# Altium footprint library LukaLIBRARY.PcbLib: 784 footprints (part 21 of 49)
Each footprint in its own frame and in the unit in brackets; x right, y up, seen from the top. Pads: shape width x height; smd on the part's side, far side on the other; paste and mask are expansions set on the pad; w line width, h text height; cw(c..) or ccw(c..) is an arc to the next point about the centre after c.
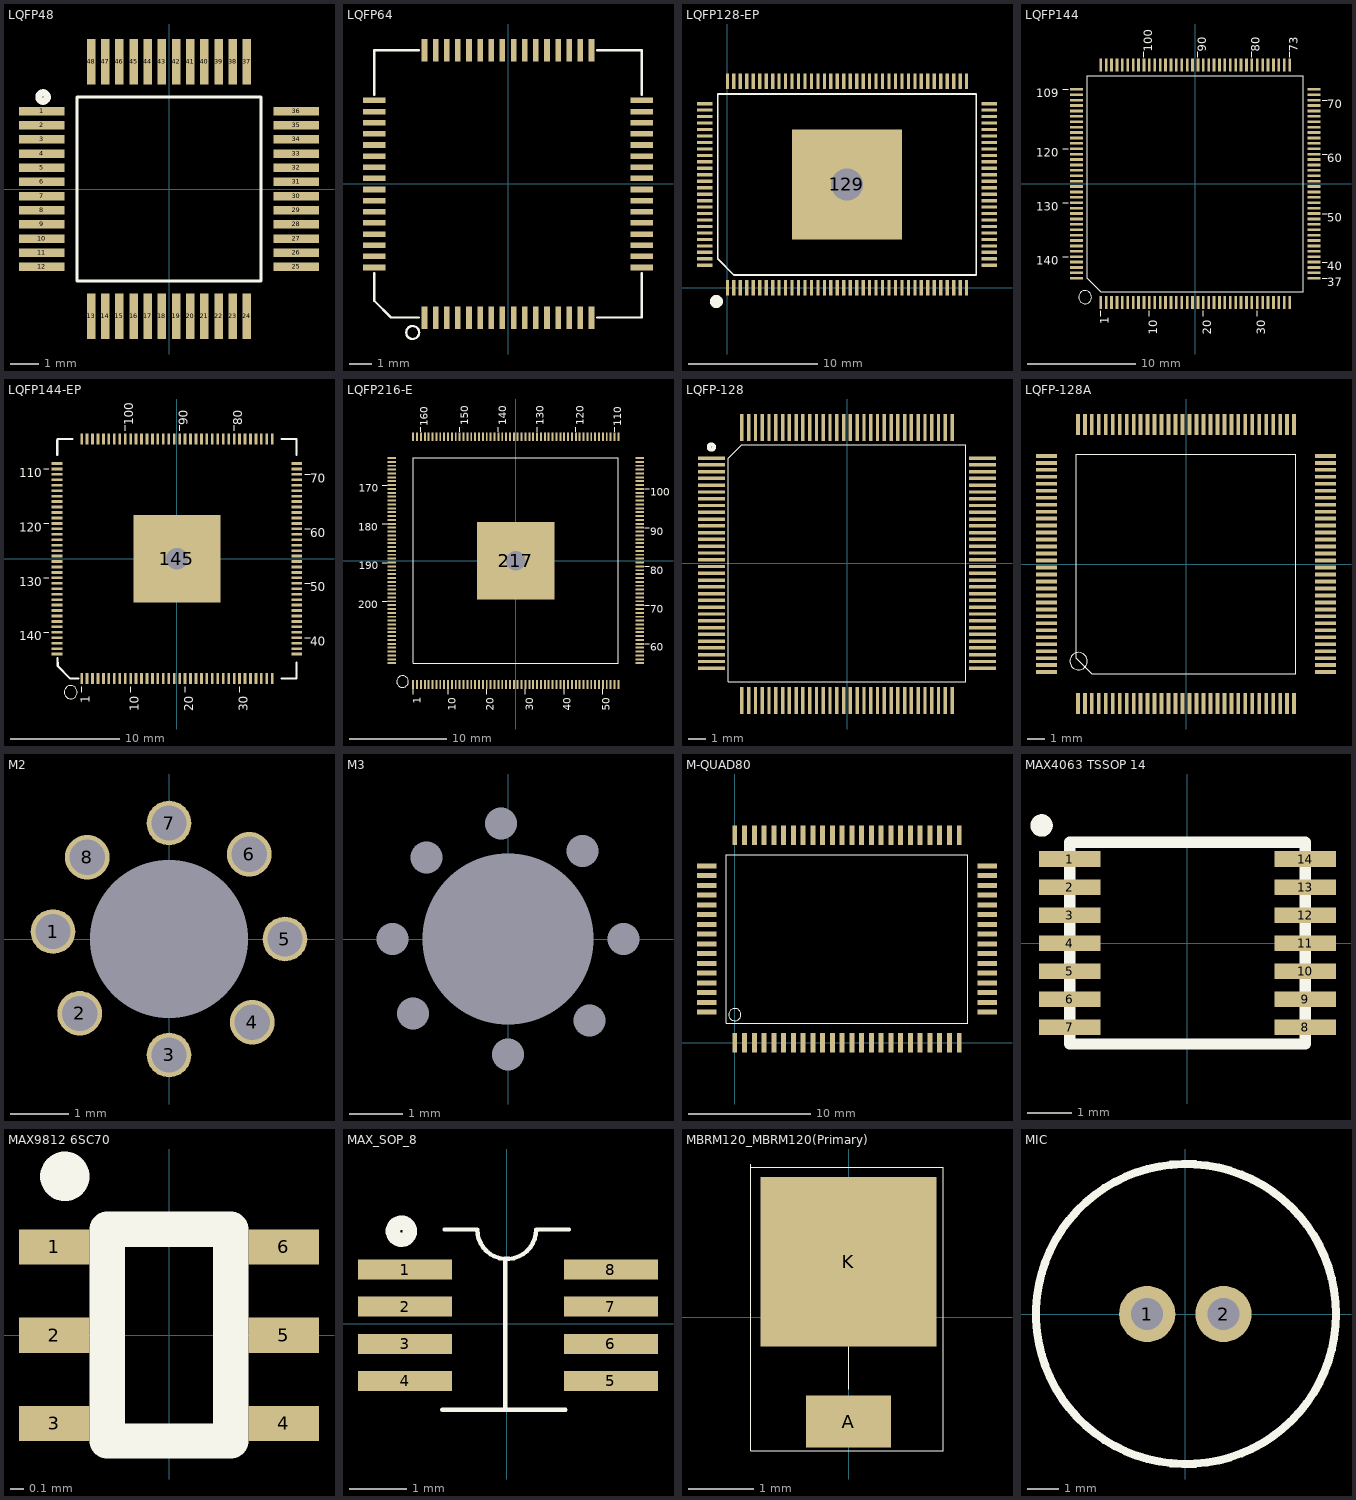
[diagram p20: the footprints below, top view; thin cyan lines are the x and y axes]

## LQFP48 [mm]
pads (48):
  rect 1.6x0.3 smd: 1(-4.5,2.75) 2(-4.5,2.25) 3(-4.5,1.75) 4(-4.5,1.25) 5(-4.5,0.75) 6(-4.5,0.25) 7(-4.5,-0.25) 8(-4.5,-0.75) 9(-4.5,-1.25) 10(-4.5,-1.75) 11(-4.5,-2.25) 12(-4.5,-2.75) 25(4.5,-2.75) 26(4.5,-2.25) 27(4.5,-1.75) 28(4.5,-1.25) 29(4.5,-0.75) 30(4.5,-0.25) 31(4.5,0.25) 32(4.5,0.75) 33(4.5,1.25) 34(4.5,1.75) 35(4.5,2.25) 36(4.5,2.75)
  rect 0.3x1.6 smd: 13(-2.75,-4.5) 14(-2.25,-4.5) 15(-1.75,-4.5) 16(-1.25,-4.5) 17(-0.75,-4.5) 18(-0.25,-4.5) 19(0.25,-4.5) 20(0.75,-4.5) 21(1.25,-4.5) 22(1.75,-4.5) 23(2.25,-4.5) 24(2.75,-4.5) 37(2.75,4.5) 38(2.25,4.5) 39(1.75,4.5) 40(1.25,4.5) 41(0.75,4.5) 42(0.25,4.5) 43(-0.25,4.5) 44(-0.75,4.5) 45(-1.25,4.5) 46(-1.75,4.5) 47(-2.25,4.5) 48(-2.75,4.5)
Top Overlay:
  circle w0.25: c-4.45,3.25 r0.15
  lines w0.1: -3.25,-3.25 3.25,-3.25 3.25,3.25 -3.25,3.25 -3.25,-3.25

## LQFP64 [mm]
pads (64):
  rect 0.25x1.016 smd mask-25.4: 1(-3.75,-6) 2(-3.25,-6) 3(-2.75,-6) 4(-2.25,-6) 5(-1.75,-6) 6(-1.25,-6) 7(-0.75,-6) 8(-0.25,-6) 9(0.25,-6) 10(0.75,-6) 11(1.25,-6) 12(1.75,-6) 13(2.25,-6) 14(2.75,-6) 15(3.25,-6) 16(3.75,-6) 33(3.75,6) 34(3.25,6) 35(2.75,6) 36(2.25,6) 37(1.75,6) 38(1.25,6) 39(0.75,6) 40(0.25,6) 41(-0.25,6) 42(-0.75,6) 43(-1.25,6) 44(-1.75,6) 45(-2.25,6) 46(-2.75,6) 47(-3.25,6) 48(-3.75,6)
  rect 1.016x0.25 smd mask-25.4: 17(6,-3.75) 18(6,-3.25) 19(6,-2.75) 20(6,-2.25) 21(6,-1.75) 22(6,-1.25) 23(6,-0.75) 24(6,-0.25) 25(6,0.25) 26(6,0.75) 27(6,1.25) 28(6,1.75) 29(6,2.25) 30(6,2.75) 31(6,3.25) 32(6,3.75) 49(-6,3.75) 50(-6,3.25) 51(-6,2.75) 52(-6,2.25) 53(-6,1.75) 54(-6,1.25) 55(-6,0.75) 56(-6,0.25) 57(-6,-0.25) 58(-6,-0.75) 59(-6,-1.25) 60(-6,-1.75) 61(-6,-2.25) 62(-6,-2.75) 63(-6,-3.25) 64(-6,-3.75)
Top Overlay:
  circle w0.1: c-4.28,-6.67 r0.291
  lines w0.1: -6,-4 -6,-5.25 -5.25,-6 -4,-6 ; -6,4 -6,6 -4,6 ; 4,-6 6,-6 6,-4 ; 4,6 6,6 6,4
Top Solder:
  drawing of 64 lines, arcs and shapes, not listed

## LQFP128-EP [mm]
pads (129):
  rect 0.25x1.2 smd mask-25.4: 1(0,0) 2(0.5,0) 3(1,0) 4(1.5,0) 5(2,0) 6(2.5,0) 7(3,0) 8(3.5,0) 9(4,0) 10(4.5,0) 11(5,0) 12(5.5,0) 13(6,0) 14(6.5,0) 15(7,0) 16(7.5,0) 17(8,0) 18(8.5,0) 19(9,0) 20(9.5,0) 21(10,0) 22(10.5,0) 23(11,0) 24(11.5,0) 25(12,0) 26(12.5,0) 27(13,0) 28(13.5,0) 29(14,0) 30(14.5,0) 31(15,0) 32(15.5,0) 33(16,0) 34(16.5,0) 35(17,0) 36(17.5,0) 37(18,0) 38(18.5,0) 65(18.5,16) 66(18,16) 67(17.5,16) 68(17,16) 69(16.5,16) 70(16,16) 71(15.5,16) 72(15,16) 73(14.5,16) 74(14,16) 75(13.5,16) 76(13,16) 77(12.5,16) 78(12,16) 79(11.5,16) 80(11,16) 81(10.5,16) 82(10,16) 83(9.5,16) 84(9,16) 85(8.5,16) 86(8,16) 87(7.5,16) 88(7,16) 89(6.5,16) 90(6,16) 91(5.5,16) 92(5,16) 93(4.5,16) 94(4,16) 95(3.5,16) 96(3,16) 97(2.5,16) 98(2,16) 99(1.5,16) 100(1,16) 101(0.5,16) 102(0,16)
  rect 1.2x0.25 smd mask-25.4: 39(20.25,1.75) 40(20.25,2.25) 41(20.25,2.75) 42(20.25,3.25) 43(20.25,3.75) 44(20.25,4.25) 45(20.25,4.75) 46(20.25,5.25) 47(20.25,5.75) 48(20.25,6.25) 49(20.25,6.75) 50(20.25,7.25) 51(20.25,7.75) 52(20.25,8.25) 53(20.25,8.75) 54(20.25,9.25) 55(20.25,9.75) 56(20.25,10.25) 57(20.25,10.75) 58(20.25,11.25) 59(20.25,11.75) 60(20.25,12.25) 61(20.25,12.75) 62(20.25,13.25) 63(20.25,13.75) 64(20.25,14.25) 103(-1.75,14.25) 104(-1.75,13.75) 105(-1.75,13.25) 106(-1.75,12.75) 107(-1.75,12.25) 108(-1.75,11.75) 109(-1.75,11.25) 110(-1.75,10.75) 111(-1.75,10.25) 112(-1.75,9.75) 113(-1.75,9.25) 114(-1.75,8.75) 115(-1.75,8.25) 116(-1.75,7.75) 117(-1.75,7.25) 118(-1.75,6.75) 119(-1.75,6.25) 120(-1.75,5.75) 121(-1.75,5.25) 122(-1.75,4.75) 123(-1.75,4.25) 124(-1.75,3.75) 125(-1.75,3.25) 126(-1.75,2.75) 127(-1.75,2.25) 128(-1.75,1.75)
  rect 8.5x8.5 hole 2.5 unplated mask-25.4: 129(9.25,8)
Top Overlay:
  circle w0.5: c-0.85,-1.05 r0.25
  lines w0.127: -0.75,2.25 0.5,1 19.25,1 19.25,15 -0.75,15 -0.75,2.25
Top Solder:
  drawing of 129 lines, arcs and shapes, not listed
Bottom Solder:
  region: 5,3.75 13.5,3.75 13.5,12.25 5,12.25

## LQFP144 [mm]
pads (144):
  rect 0.25x1.2 smd mask-25.4: 1(-8.75,-11) 2(-8.25,-11) 3(-7.75,-11) 4(-7.25,-11) 5(-6.75,-11) 6(-6.25,-11) 7(-5.75,-11) 8(-5.25,-11) 9(-4.75,-11) 10(-4.25,-11) 11(-3.75,-11) 12(-3.25,-11) 13(-2.75,-11) 14(-2.25,-11) 15(-1.75,-11) 16(-1.25,-11) 17(-0.75,-11) 18(-0.25,-11) 19(0.25,-11) 20(0.75,-11) 21(1.25,-11) 22(1.75,-11) 23(2.25,-11) 24(2.75,-11) 25(3.25,-11) 26(3.75,-11) 27(4.25,-11) 28(4.75,-11) 29(5.25,-11) 30(5.75,-11) 31(6.25,-11) 32(6.75,-11) 33(7.25,-11) 34(7.75,-11) 35(8.25,-11) 36(8.75,-11) 73(8.75,11) 74(8.25,11) 75(7.75,11) 76(7.25,11) 77(6.75,11) 78(6.25,11) 79(5.75,11) 80(5.25,11) 81(4.75,11) 82(4.25,11) 83(3.75,11) 84(3.25,11) 85(2.75,11) 86(2.25,11) 87(1.75,11) 88(1.25,11) 89(0.75,11) 90(0.25,11) 91(-0.25,11) 92(-0.75,11) 93(-1.25,11) 94(-1.75,11) 95(-2.25,11) 96(-2.75,11) 97(-3.25,11) 98(-3.75,11) 99(-4.25,11) 100(-4.75,11) 101(-5.25,11) 102(-5.75,11) 103(-6.25,11) 104(-6.75,11) 105(-7.25,11) 106(-7.75,11) 107(-8.25,11) 108(-8.75,11)
  rect 1.2x0.25 smd mask-25.4: 37(11,-8.75) 38(11,-8.25) 39(11,-7.75) 40(11,-7.25) 41(11,-6.75) 42(11,-6.25) 43(11,-5.75) 44(11,-5.25) 45(11,-4.75) 46(11,-4.25) 47(11,-3.75) 48(11,-3.25) 49(11,-2.75) 50(11,-2.25) 51(11,-1.75) 52(11,-1.25) 53(11,-0.75) 54(11,-0.25) 55(11,0.25) 56(11,0.75) 57(11,1.25) 58(11,1.75) 59(11,2.25) 60(11,2.75) 61(11,3.25) 62(11,3.75) 63(11,4.25) 64(11,4.75) 65(11,5.25) 66(11,5.75) 67(11,6.25) 68(11,6.75) 69(11,7.25) 70(11,7.75) 71(11,8.25) 72(11,8.75) 109(-11,8.75) 110(-11,8.25) 111(-11,7.75) 112(-11,7.25) 113(-11,6.75) 114(-11,6.25) 115(-11,5.75) 116(-11,5.25) 117(-11,4.75) 118(-11,4.25) 119(-11,3.75) 120(-11,3.25) 121(-11,2.75) 122(-11,2.25) 123(-11,1.75) 124(-11,1.25) 125(-11,0.75) 126(-11,0.25) 127(-11,-0.25) 128(-11,-0.75) 129(-11,-1.25) 130(-11,-1.75) 131(-11,-2.25) 132(-11,-2.75) 133(-11,-3.25) 134(-11,-3.75) 135(-11,-4.25) 136(-11,-4.75) 137(-11,-5.25) 138(-11,-5.75) 139(-11,-6.25) 140(-11,-6.75) 141(-11,-7.25) 142(-11,-7.75) 143(-11,-8.25) 144(-11,-8.75)
Top Overlay:
  circle w0.1: c-10.2,-10.5 r0.6
  lines w0.1: -12.25,-6.75 -11.75,-6.75 ; -12.25,-1.75 -11.75,-1.75 ; -12.25,3.25 -11.75,3.25 ; -12.25,8.75 -11.75,8.75 ; -8.75,-12.25 -8.75,-11.75 ; -4.75,11.75 -4.75,12.25 ; -4.25,-12.25 -4.25,-11.75 ; 0.25,11.75 0.25,12.25 ; 0.75,-12.25 0.75,-11.75 ; 5.25,11.75 5.25,12.25 ; 5.75,-12.25 5.75,-11.75 ; 8.75,11.75 8.75,12.25 ; 11.75,-8.75 12.25,-8.75 ; 11.75,-7.25 12.25,-7.25 ; 11.75,-2.75 12.25,-2.75 ; 11.75,2.75 12.25,2.75 ; 11.75,7.75 12.25,7.75 ; -10,-8.75 -10,10 10,10 10,-10 -8.75,-10 -10,-8.75
  text "90" at 1,12.25 h0.79
  text "20" at 1.5,-14 h0.79
  text "70" at 12.25,7 h0.79
  text "40" at 12.25,-8 h0.79
  text "73" at 9.5,12.25 h0.79
  text "60" at 12.25,2 h0.79
  text "50" at 12.25,-3.5 h0.79
  text "37" at 12.25,-9.5 h0.79
  text "80" at 6,12.25 h0.79
  text "30" at 6.5,-14 h0.79
  text "100" at -4,12.25 h0.79
  text "10" at -3.5,-14 h0.79
  text "109" at -14.75,8 h0.79
  text "120" at -14.75,2.5 h0.79
  text "130" at -14.75,-2.5 h0.79
  text "140" at -14.75,-7.5 h0.79
  text "1" at -8,-13 h0.79
Top Solder:
  drawing of 144 lines, arcs and shapes, not listed

## LQFP144-EP [mm]
pads (145):
  rect 0.25x1 smd mask-25.4: 1(-8.75,-11) 2(-8.25,-11) 3(-7.75,-11) 4(-7.25,-11) 5(-6.75,-11) 6(-6.25,-11) 7(-5.75,-11) 8(-5.25,-11) 9(-4.75,-11) 10(-4.25,-11) 11(-3.75,-11) 12(-3.25,-11) 13(-2.75,-11) 14(-2.25,-11) 15(-1.75,-11) 16(-1.25,-11) 17(-0.75,-11) 18(-0.25,-11) 19(0.25,-11) 20(0.75,-11) 21(1.25,-11) 22(1.75,-11) 23(2.25,-11) 24(2.75,-11) 25(3.25,-11) 26(3.75,-11) 27(4.25,-11) 28(4.75,-11) 29(5.25,-11) 30(5.75,-11) 31(6.25,-11) 32(6.75,-11) 33(7.25,-11) 34(7.75,-11) 35(8.25,-11) 36(8.75,-11) 73(8.75,11) 74(8.25,11) 75(7.75,11) 76(7.25,11) 77(6.75,11) 78(6.25,11) 79(5.75,11) 80(5.25,11) 81(4.75,11) 82(4.25,11) 83(3.75,11) 84(3.25,11) 85(2.75,11) 86(2.25,11) 87(1.75,11) 88(1.25,11) 89(0.75,11) 90(0.25,11) 91(-0.25,11) 92(-0.75,11) 93(-1.25,11) 94(-1.75,11) 95(-2.25,11) 96(-2.75,11) 97(-3.25,11) 98(-3.75,11) 99(-4.25,11) 100(-4.75,11) 101(-5.25,11) 102(-5.75,11) 103(-6.25,11) 104(-6.75,11) 105(-7.25,11) 106(-7.75,11) 107(-8.25,11) 108(-8.75,11)
  rect 1x0.25 smd mask-25.4: 37(11,-8.75) 38(11,-8.25) 39(11,-7.75) 40(11,-7.25) 41(11,-6.75) 42(11,-6.25) 43(11,-5.75) 44(11,-5.25) 45(11,-4.75) 46(11,-4.25) 47(11,-3.75) 48(11,-3.25) 49(11,-2.75) 50(11,-2.25) 51(11,-1.75) 52(11,-1.25) 53(11,-0.75) 54(11,-0.25) 55(11,0.25) 56(11,0.75) 57(11,1.25) 58(11,1.75) 59(11,2.25) 60(11,2.75) 61(11,3.25) 62(11,3.75) 63(11,4.25) 64(11,4.75) 65(11,5.25) 66(11,5.75) 67(11,6.25) 68(11,6.75) 69(11,7.25) 70(11,7.75) 71(11,8.25) 72(11,8.75) 109(-11,8.75) 110(-11,8.25) 111(-11,7.75) 112(-11,7.25) 113(-11,6.75) 114(-11,6.25) 115(-11,5.75) 116(-11,5.25) 117(-11,4.75) 118(-11,4.25) 119(-11,3.75) 120(-11,3.25) 121(-11,2.75) 122(-11,2.25) 123(-11,1.75) 124(-11,1.25) 125(-11,0.75) 126(-11,0.25) 127(-11,-0.25) 128(-11,-0.75) 129(-11,-1.25) 130(-11,-1.75) 131(-11,-2.25) 132(-11,-2.75) 133(-11,-3.25) 134(-11,-3.75) 135(-11,-4.25) 136(-11,-4.75) 137(-11,-5.25) 138(-11,-5.75) 139(-11,-6.25) 140(-11,-6.75) 141(-11,-7.25) 142(-11,-7.75) 143(-11,-8.25) 144(-11,-8.75)
  rect 8x8 hole 2 unplated mask-25.4: 145(0,0)
Top Overlay:
  circle w0.1: c-9.75,-12.25 r0.6
  lines w0.1: -12.25,-6.75 -11.75,-6.75 ; -12.25,-1.75 -11.75,-1.75 ; -12.25,3.25 -11.75,3.25 ; -12.25,8.25 -11.75,8.25 ; -8.75,-12.25 -8.75,-11.75 ; -4.75,11.75 -4.75,12.25 ; -4.25,-12.25 -4.25,-11.75 ; 0.25,11.75 0.25,12.25 ; 0.75,-12.25 0.75,-11.75 ; 5.25,11.75 5.25,12.25 ; 5.75,-12.25 5.75,-11.75 ; 11.75,-7.25 12.25,-7.25 ; 11.75,-2.25 12.25,-2.25 ; 11.75,2.75 12.25,2.75 ; 11.75,7.75 12.25,7.75
  lines w0.2: -10.99,9.55 -10.99,10.9 ; -10.96,-9.1 -10.95,-9.85 -9.8,-11 -9.05,-10.99 ; -10.95,10.99 -9.6,10.99 ; 9.6,-10.99 10.95,-10.99 ; 9.6,10.99 10.95,10.99 ; 10.99,-10.9 10.99,-9.55 ; 10.99,9.55 10.99,10.9
  text "90" at 1,12.25 h0.79
  text "60" at 12.25,2 h0.79
  text "120" at -14.5,2.5 h0.79
  text "70" at 12.25,7 h0.79
  text "50" at 12.25,-3 h0.79
  text "40" at 12.25,-8 h0.79
  text "80" at 6,12.25 h0.79
  text "30" at 6.5,-14 h0.79
  text "20" at 1.5,-14 h0.79
  text "100" at -4,12.25 h0.79
  text "10" at -3.5,-14 h0.79
  text "110" at -14.5,7.5 h0.79
  text "130" at -14.5,-2.5 h0.79
  text "140" at -14.5,-7.5 h0.79
  text "1" at -8,-13.25 h0.79
Top Solder:
  drawing of 145 lines, arcs and shapes, not listed
Bottom Solder:
  region: -4,4 -4,-4 4,-4 4,4

## LQFP216-E [mm]
pads (217):
  rect 0.2x0.9 smd: 1(-10.6,-12.8) 2(-10.2,-12.8) 3(-9.8,-12.8) 4(-9.4,-12.8) 5(-9,-12.8) 6(-8.6,-12.8) 7(-8.2,-12.8) 8(-7.8,-12.8) 9(-7.4,-12.8) 10(-7,-12.8) 11(-6.6,-12.8) 12(-6.2,-12.8) 13(-5.8,-12.8) 14(-5.4,-12.8) 15(-5,-12.8) 16(-4.6,-12.8) 17(-4.2,-12.8) 18(-3.8,-12.8) 19(-3.4,-12.8) 20(-3,-12.8) 21(-2.6,-12.8) 22(-2.2,-12.8) 23(-1.8,-12.8) 24(-1.4,-12.8) 25(-1,-12.8) 26(-0.6,-12.8) 27(-0.2,-12.8) 28(0.2,-12.8) 29(0.6,-12.8) 30(1,-12.8) 31(1.4,-12.8) 32(1.8,-12.8) 33(2.2,-12.8) 34(2.6,-12.8) 35(3,-12.8) 36(3.4,-12.8) 37(3.8,-12.8) 38(4.2,-12.8) 39(4.6,-12.8) 40(5,-12.8) 41(5.4,-12.8) 42(5.8,-12.8) 43(6.2,-12.8) 44(6.6,-12.8) 45(7,-12.8) 46(7.4,-12.8) 47(7.8,-12.8) 48(8.2,-12.8) 49(8.6,-12.8) 50(9,-12.8) 51(9.4,-12.8) 52(9.8,-12.8) 53(10.2,-12.8) 54(10.6,-12.8) 109(10.6,12.8) 110(10.2,12.8) 111(9.8,12.8) 112(9.4,12.8) 113(9,12.8) 114(8.6,12.8) 115(8.2,12.8) 116(7.8,12.8) 117(7.4,12.8) 118(7,12.8) 119(6.6,12.8) 120(6.2,12.8) 121(5.8,12.8) 122(5.4,12.8) 123(5,12.8) 124(4.6,12.8) 125(4.2,12.8) 126(3.8,12.8) 127(3.4,12.8) 128(3,12.8) 129(2.6,12.8) 130(2.2,12.8) 131(1.8,12.8) 132(1.4,12.8) 133(1,12.8) 134(0.6,12.8) 135(0.2,12.8) 136(-0.2,12.8) 137(-0.6,12.8) 138(-1,12.8) 139(-1.4,12.8) 140(-1.8,12.8) 141(-2.2,12.8) 142(-2.6,12.8) 143(-3,12.8) 144(-3.4,12.8) 145(-3.8,12.8) 146(-4.2,12.8) 147(-4.6,12.8) 148(-5,12.8) 149(-5.4,12.8) 150(-5.8,12.8) 151(-6.2,12.8) 152(-6.6,12.8) 153(-7,12.8) 154(-7.4,12.8) 155(-7.8,12.8) 156(-8.2,12.8) 157(-8.6,12.8) 158(-9,12.8) 159(-9.4,12.8) 160(-9.8,12.8) 161(-10.2,12.8) 162(-10.6,12.8)
  rect 0.9x0.2 smd: 55(12.8,-10.6) 56(12.8,-10.2) 57(12.8,-9.8) 58(12.8,-9.4) 59(12.8,-9) 60(12.8,-8.6) 61(12.8,-8.2) 62(12.8,-7.8) 63(12.8,-7.4) 64(12.8,-7) 65(12.8,-6.6) 66(12.8,-6.2) 67(12.8,-5.8) 68(12.8,-5.4) 69(12.8,-5) 70(12.8,-4.6) 71(12.8,-4.2) 72(12.8,-3.8) 73(12.8,-3.4) 74(12.8,-3) 75(12.8,-2.6) 76(12.8,-2.2) 77(12.8,-1.8) 78(12.8,-1.4) 79(12.8,-1) 80(12.8,-0.6) 81(12.8,-0.2) 82(12.8,0.2) 83(12.8,0.6) 84(12.8,1) 85(12.8,1.4) 86(12.8,1.8) 87(12.8,2.2) 88(12.8,2.6) 89(12.8,3) 90(12.8,3.4) 91(12.8,3.8) 92(12.8,4.2) 93(12.8,4.6) 94(12.8,5) 95(12.8,5.4) 96(12.8,5.8) 97(12.8,6.2) 98(12.8,6.6) 99(12.8,7) 100(12.8,7.4) 101(12.8,7.8) 102(12.8,8.2) 103(12.8,8.6) 104(12.8,9) 105(12.8,9.4) 106(12.8,9.8) 107(12.8,10.2) 108(12.8,10.6) 163(-12.8,10.6) 164(-12.8,10.2) 165(-12.8,9.8) 166(-12.8,9.4) 167(-12.8,9) 168(-12.8,8.6) 169(-12.8,8.2) 170(-12.8,7.8) 171(-12.8,7.4) 172(-12.8,7) 173(-12.8,6.6) 174(-12.8,6.2) 175(-12.8,5.8) 176(-12.8,5.4) 177(-12.8,5) 178(-12.8,4.6) 179(-12.8,4.2) 180(-12.8,3.8) 181(-12.8,3.4) 182(-12.8,3) 183(-12.8,2.6) 184(-12.8,2.2) 185(-12.8,1.8) 186(-12.8,1.4) 187(-12.8,1) 188(-12.8,0.6) 189(-12.8,0.2) 190(-12.8,-0.2) 191(-12.8,-0.6) 192(-12.8,-1) 193(-12.8,-1.4) 194(-12.8,-1.8) 195(-12.8,-2.2) 196(-12.8,-2.6) 197(-12.8,-3) 198(-12.8,-3.4) 199(-12.8,-3.8) 200(-12.8,-4.2) 201(-12.8,-4.6) 202(-12.8,-5) 203(-12.8,-5.4) 204(-12.8,-5.8) 205(-12.8,-6.2) 206(-12.8,-6.6) 207(-12.8,-7) 208(-12.8,-7.4) 209(-12.8,-7.8) 210(-12.8,-8.2) 211(-12.8,-8.6) 212(-12.8,-9) 213(-12.8,-9.4) 214(-12.8,-9.8) 215(-12.8,-10.2) 216(-12.8,-10.6)
  rect 8x8 on Top hole 2 unplated: 217(0,0)
Top Overlay:
  circle w0.1: c-11.7,-12.5 r0.6
  lines w0.1: -13.8,-4.2 -13.3,-4.2 ; -13.8,-0.2 -13.3,-0.2 ; -13.8,3.8 -13.3,3.8 ; -13.8,7.8 -13.3,7.8 ; -10.6,-13.8 -10.6,-13.3 ; -9.8,13.3 -9.8,13.8 ; -7,-13.8 -7,-13.3 ; -5.8,13.3 -5.8,13.8 ; -3,-13.8 -3,-13.3 ; -1.8,13.3 -1.8,13.8 ; 1,-13.8 1,-13.3 ; 2.2,13.3 2.2,13.8 ; 5,-13.8 5,-13.3 ; 6.2,13.3 6.2,13.8 ; 9,-13.8 9,-13.3 ; 10.2,13.3 10.2,13.8 ; 13.3,-8.6 13.8,-8.6 ; 13.3,-4.6 13.8,-4.6 ; 13.3,-0.6 13.8,-0.6 ; 13.3,3.4 13.8,3.4 ; 13.3,7.4 13.8,7.4 ; -10.6,-10.6 -10.6,10.6 10.6,10.6 10.6,-10.6 -10.6,-10.6
  text "190" at -16.2,-0.9 h0.79
  text "170" at -16.2,7.1 h0.79
  text "10" at -6.2,-15.5 h0.79
  text "150" at -4.9,14 h0.79
  text "160" at -9.1,13.9 h0.79
  text "30" at 1.8,-15.5 h0.79
  text "130" at 2.9,14 h0.79
  text "140" at -1,14 h0.79
  text "50" at 9.7,-15.5 h0.79
  text "110" at 10.9,13.9 h0.79
  text "120" at 7,14 h0.79
  text "60" at 13.9,-9.3 h0.79
  text "80" at 13.9,-1.4 h0.79
  text "100" at 13.9,6.7 h0.79
  text "180" at -16.3,3.1 h0.79
  text "200" at -16.3,-4.9 h0.79
  text "70" at 13.9,-5.4 h0.79
  text "90" at 13.9,2.6 h0.79
  text "1" at -9.8,-14.8 h0.79
  text "20" at -2.3,-15.5 h0.79
  text "40" at 5.7,-15.5 h0.79

## LQFP-128 [mm]
pads (128):
  rect 1.6x0.2 smd: 1(-8,6.2) 2(-8,5.8) 3(-8,5.4) 4(-8,5) 5(-8,4.6) 6(-8,4.2) 7(-8,3.8) 8(-8,3.4) 9(-8,3) 10(-8,2.6) 11(-8,2.2) 12(-8,1.8) 13(-8,1.4) 14(-8,1) 15(-8,0.6) 16(-8,0.2) 17(-8,-0.2) 18(-8,-0.6) 19(-8,-1) 20(-8,-1.4) 21(-8,-1.8) 22(-8,-2.2) 23(-8,-2.6) 24(-8,-3) 25(-8,-3.4) 26(-8,-3.8) 27(-8,-4.2) 28(-8,-4.6) 29(-8,-5) 30(-8,-5.4) 31(-8,-5.8) 32(-8,-6.2) 65(8,-6.2) 66(8,-5.8) 67(8,-5.4) 68(8,-5) 69(8,-4.6) 70(8,-4.2) 71(8,-3.8) 72(8,-3.4) 73(8,-3) 74(8,-2.6) 75(8,-2.2) 76(8,-1.8) 77(8,-1.4) 78(8,-1) 79(8,-0.6) 80(8,-0.2) 81(8,0.2) 82(8,0.6) 83(8,1) 84(8,1.4) 85(8,1.8) 86(8,2.2) 87(8,2.6) 88(8,3) 89(8,3.4) 90(8,3.8) 91(8,4.2) 92(8,4.6) 93(8,5) 94(8,5.4) 95(8,5.8) 96(8,6.2)
  rect 0.2x1.6 smd: 33(-6.2,-8.1) 34(-5.8,-8.1) 35(-5.4,-8.1) 36(-5,-8.1) 37(-4.6,-8.1) 38(-4.2,-8.1) 39(-3.8,-8.1) 40(-3.4,-8.1) 41(-3,-8.1) 42(-2.6,-8.1) 43(-2.2,-8.1) 44(-1.8,-8.1) 45(-1.4,-8.1) 46(-1,-8.1) 47(-0.6,-8.1) 48(-0.2,-8.1) 49(0.2,-8.1) 50(0.6,-8.1) 51(1,-8.1) 52(1.4,-8.1) 53(1.8,-8.1) 54(2.2,-8.1) 55(2.6,-8.1) 56(3,-8.1) 57(3.4,-8.1) 58(3.8,-8.1) 59(4.2,-8.1) 60(4.6,-8.1) 61(5,-8.1) 62(5.4,-8.1) 63(5.8,-8.1) 64(6.2,-8.1) 97(6.2,8) 98(5.8,8) 99(5.4,8) 100(5,8) 101(4.6,8) 102(4.2,8) 103(3.8,8) 104(3.4,8) 105(3,8) 106(2.6,8) 107(2.2,8) 108(1.8,8) 109(1.4,8) 110(1,8) 111(0.6,8) 112(0.2,8) 113(-0.2,8) 114(-0.6,8) 115(-1,8) 116(-1.4,8) 117(-1.8,8) 118(-2.2,8) 119(-2.6,8) 120(-3,8) 121(-3.4,8) 122(-3.8,8) 123(-4.2,8) 124(-4.6,8) 125(-5,8) 126(-5.4,8) 127(-5.8,8) 128(-6.2,8)
Top Overlay:
  circle w0.25: c-8,6.85 r0.15
  lines w0.07: -7,-7 -7,6.2 -6.2,7 7,7 7,-7 -7,-7

## LQFP-128A [mm]
pads (128):
  rect 0.22x1.2 smd mask-25.4: 1(-6.2,-8) 2(-5.8,-8) 3(-5.4,-8) 4(-5,-8) 5(-4.6,-8) 6(-4.2,-8) 7(-3.8,-8) 8(-3.4,-8) 9(-3,-8) 10(-2.6,-8) 11(-2.2,-8) 12(-1.8,-8) 13(-1.4,-8) 14(-1,-8) 15(-0.6,-8) 16(-0.2,-8) 17(0.2,-8) 18(0.6,-8) 19(1,-8) 20(1.4,-8) 21(1.8,-8) 22(2.2,-8) 23(2.6,-8) 24(3,-8) 25(3.4,-8) 26(3.8,-8) 27(4.2,-8) 28(4.6,-8) 29(5,-8) 30(5.4,-8) 31(5.8,-8) 32(6.2,-8) 65(6.2,8) 66(5.8,8) 67(5.4,8) 68(5,8) 69(4.6,8) 70(4.2,8) 71(3.8,8) 72(3.4,8) 73(3,8) 74(2.6,8) 75(2.2,8) 76(1.8,8) 77(1.4,8) 78(1,8) 79(0.6,8) 80(0.2,8) 81(-0.2,8) 82(-0.6,8) 83(-1,8) 84(-1.4,8) 85(-1.8,8) 86(-2.2,8) 87(-2.6,8) 88(-3,8) 89(-3.4,8) 90(-3.8,8) 91(-4.2,8) 92(-4.6,8) 93(-5,8) 94(-5.4,8) 95(-5.8,8) 96(-6.2,8)
  rect 1.2x0.22 smd mask-25.4: 33(8,-6.2) 34(8,-5.8) 35(8,-5.4) 36(8,-5) 37(8,-4.6) 38(8,-4.2) 39(8,-3.8) 40(8,-3.4) 41(8,-3) 42(8,-2.6) 43(8,-2.2) 44(8,-1.8) 45(8,-1.4) 46(8,-1) 47(8,-0.6) 48(8,-0.2) 49(8,0.2) 50(8,0.6) 51(8,1) 52(8,1.4) 53(8,1.8) 54(8,2.2) 55(8,2.6) 56(8,3) 57(8,3.4) 58(8,3.8) 59(8,4.2) 60(8,4.6) 61(8,5) 62(8,5.4) 63(8,5.8) 64(8,6.2) 97(-8,6.2) 98(-8,5.8) 99(-8,5.4) 100(-8,5) 101(-8,4.6) 102(-8,4.2) 103(-8,3.8) 104(-8,3.4) 105(-8,3) 106(-8,2.6) 107(-8,2.2) 108(-8,1.8) 109(-8,1.4) 110(-8,1) 111(-8,0.6) 112(-8,0.2) 113(-8,-0.2) 114(-8,-0.6) 115(-8,-1) 116(-8,-1.4) 117(-8,-1.8) 118(-8,-2.2) 119(-8,-2.6) 120(-8,-3) 121(-8,-3.4) 122(-8,-3.8) 123(-8,-4.2) 124(-8,-4.6) 125(-8,-5) 126(-8,-5.4) 127(-8,-5.8) 128(-8,-6.2)
Top Overlay:
  circle w0.025: c-6.16,-5.57 r0.5
  lines w0.01: -6.3,-5.4 -6.3,6.3 6.3,6.3 6.3,-6.3 -5.4,-6.3 -6.3,-5.4
Top Solder:
  drawing of 128 lines, arcs and shapes, not listed

## M2 [mil]
pads (9):
  round 30 hole 23.62: 1(-78,5) 2(-60,-50) 3(0,-78) 4(56,-56) 5(78,0) 6(54,57) 7(0,78) 8(-55,55)
  round 0 hole 106.3 mask-1000: 9(0,0)
Top Solder:
  region: 0,100.88 -19.68,98.94 -38.6,93.2 -56.05,83.88 -71.33,71.33 -83.88,56.05 -93.2,38.6 -98.94,19.68 -100.88,0 -98.94,-19.68 -93.2,-38.6 -83.88,-56.05 -71.33,-71.33 -56.05,-83.88 -38.6,-93.2 -19.68,-98.94 0,-100.88 19.68,-98.94 38.6,-93.2 56.05,-83.88 71.33,-71.33 83.88,-56.05 93.2,-38.6 98.94,-19.68 100.88,0 98.94,19.68 93.2,38.6 83.88,56.05 71.33,71.33 56.05,83.88 38.6,93.2 19.68,98.94
Bottom Solder:
  region: 0,100.88 -19.68,98.94 -38.6,93.2 -56.05,83.88 -71.33,71.33 -83.88,56.05 -93.2,38.6 -98.94,19.68 -100.88,0 -98.94,-19.68 -93.2,-38.6 -83.88,-56.05 -71.33,-71.33 -56.05,-83.88 -38.6,-93.2 -19.68,-98.94 0,-100.88 19.68,-98.94 38.6,-93.2 56.05,-83.88 71.33,-71.33 83.88,-56.05 93.2,-38.6 98.94,-19.68 100.88,0 98.94,19.68 93.2,38.6 83.88,56.05 71.33,71.33 56.05,83.88 38.6,93.2 19.68,98.94

## M3 [mil]
pads (9):
  round 0 hole 23.62 mask-1000: 1(-85,0) 2(-70,-55) 3(0,-85) 4(60,-60) 5(85,0) 6(55,65) 7(-5,85) 8(-60,60)
  round 0 hole 125.98 mask-1000: 9(0,0)
Top Solder:
  drawing of 9 lines, arcs and shapes, not listed
Bottom Solder:
  drawing of 9 lines, arcs and shapes, not listed

## M-QUAD80 [mm]
pads (80):
  rect 0.4x1.6 smd mask-25.4: 1(0,0) 2(0.8,0) 3(1.6,0) 4(2.4,0) 5(3.2,0) 6(4,0) 7(4.8,0) 8(5.6,0) 9(6.4,0) 10(7.2,0) 11(8,0) 12(8.8,0) 13(9.6,0) 14(10.4,0) 15(11.2,0) 16(12,0) 17(12.8,0) 18(13.6,0) 19(14.4,0) 20(15.2,0) 21(16,0) 22(16.8,0) 23(17.6,0) 24(18.4,0) 41(18.4,17) 42(17.6,17) 43(16.8,17) 44(16,17) 45(15.2,17) 46(14.4,17) 47(13.6,17) 48(12.8,17) 49(12,17) 50(11.2,17) 51(10.4,17) 52(9.6,17) 53(8.8,17) 54(8,17) 55(7.2,17) 56(6.4,17) 57(5.6,17) 58(4.8,17) 59(4,17) 60(3.2,17) 61(2.4,17) 62(1.6,17) 63(0.8,17) 64(0,17)
  rect 1.6x0.4 smd mask-25.4: 25(20.7,2.5) 26(20.7,3.3) 27(20.7,4.1) 28(20.7,4.9) 29(20.7,5.7) 30(20.7,6.5) 31(20.7,7.3) 32(20.7,8.1) 33(20.7,8.9) 34(20.7,9.7) 35(20.7,10.5) 36(20.7,11.3) 37(20.7,12.1) 38(20.7,12.9) 39(20.7,13.7) 40(20.7,14.5) 65(-2.3,14.5) 66(-2.3,13.7) 67(-2.3,12.9) 68(-2.3,12.1) 69(-2.3,11.3) 70(-2.3,10.5) 71(-2.3,9.7) 72(-2.3,8.9) 73(-2.3,8.1) 74(-2.3,7.3) 75(-2.3,6.5) 76(-2.3,5.7) 77(-2.3,4.9) 78(-2.3,4.1) 79(-2.3,3.3) 80(-2.3,2.5)
Top Overlay:
  circle w0.025: c0,2.3 r0.5
  lines w0.025: -0.7,1.6 -0.7,15.4 19.1,15.4 19.1,1.6 -0.7,1.6
Top Solder:
  drawing of 80 lines, arcs and shapes, not listed

## MAX4063 TSSOP 14 [mil]
pads (14):
  rect 55x14 smd: 1(-105,75) 2(-105,50) 3(-105,25) 4(-105,0) 5(-105,-25) 6(-105,-50) 7(-105,-75) 8(105,-75) 9(105,-50) 10(105,-25) 11(105,0) 12(105,25) 13(105,50) 14(105,75)
Top Overlay:
  circle w10: c-130,105 r5
  lines w10: -105,-90 105,-90 105,90 -105,90 -105,-90

## MAX9812 6SC70 [mil]
pads (6):
  rect 20x10 smd: 1(-32.5,25) 2(-32.5,0) 3(-32.5,-25) 4(32.5,-25) 5(32.5,0) 6(32.5,25)
Top Overlay:
  circle w10: c-29.5,45 r2
  lines w10: -17.5,-30 17.5,-30 17.5,30 -17.5,30 -17.5,-30

## MAX_SOP_8 [mm]
pads (8):
  rect 1.65x0.35 smd mask-25.4: 1(-1.779,0.946) 2(-1.779,0.296) 3(-1.779,-0.354) 4(-1.779,-1.004) 5(1.824,-1.004) 6(1.824,-0.354) 7(1.824,0.296) 8(1.824,0.946)
Top Overlay:
  circle w0.25: c-1.843,1.616 r0.15
  lines w0.076: -1.131,-1.509 1.029,-1.509 ; -1.09,1.646 -0.517,1.646 ccw(c0,1.646) 0.517,1.646 1.09,1.646 ; -0.028,1.093 -0.025,-1.499
Top Solder:
  region: -2.604,-0.529 -0.954,-0.529 -0.954,-0.179 -2.604,-0.179
  region: -2.604,-1.179 -0.954,-1.179 -0.954,-0.829 -2.604,-0.829
  region: 0.999,-1.179 2.649,-1.179 2.649,-0.829 0.999,-0.829
  region: 0.999,-0.529 2.649,-0.529 2.649,-0.179 0.999,-0.179
  region: -2.604,0.771 -0.954,0.771 -0.954,1.121 -2.604,1.121
  region: 0.999,0.771 2.649,0.771 2.649,1.121 0.999,1.121
  region: -2.604,0.121 -0.954,0.121 -0.954,0.471 -2.604,0.471
  region: 0.999,0.121 2.649,0.121 2.649,0.471 0.999,0.471

## MBRM120_MBRM120(Primary) [mm]
pads (2):
  rect 1.3x0.8 smd mask-25.4: A(0,-1.6)
  rect 2.7x2.6 smd mask-25.4: K(0,0.85)
Top Overlay:
  lines w0.01: -1.5,1.8 -1.5,2.3 1.45,2.3 1.45,-2.05 -1.5,-2.05 -1.5,2.35 ; 0,-1.1 0,-0.45
Top Solder:
  region: -1.35,-0.45 1.35,-0.45 1.35,2.15 -1.35,2.15
  region: -0.65,-2 0.65,-2 0.65,-1.2 -0.65,-1.2

## MIC [mil]
pads (2):
  round 70 hole 40: 1(-47.5,0) 2(47.5,0)
Top Overlay:
  circle w10: c0.82,0 r186.68